# Altium footprint library RDM_ALT_PCB.PcbLib: 171 footprints (part 8 of 11)
Each footprint in its own frame and in the unit in brackets; x right, y up, seen from the top. Pads: shape width x height; smd on the part's side, far side on the other; paste and mask are expansions set on the pad; w line width, h text height; cw(c..) or ccw(c..) is an arc to the next point about the centre after c.
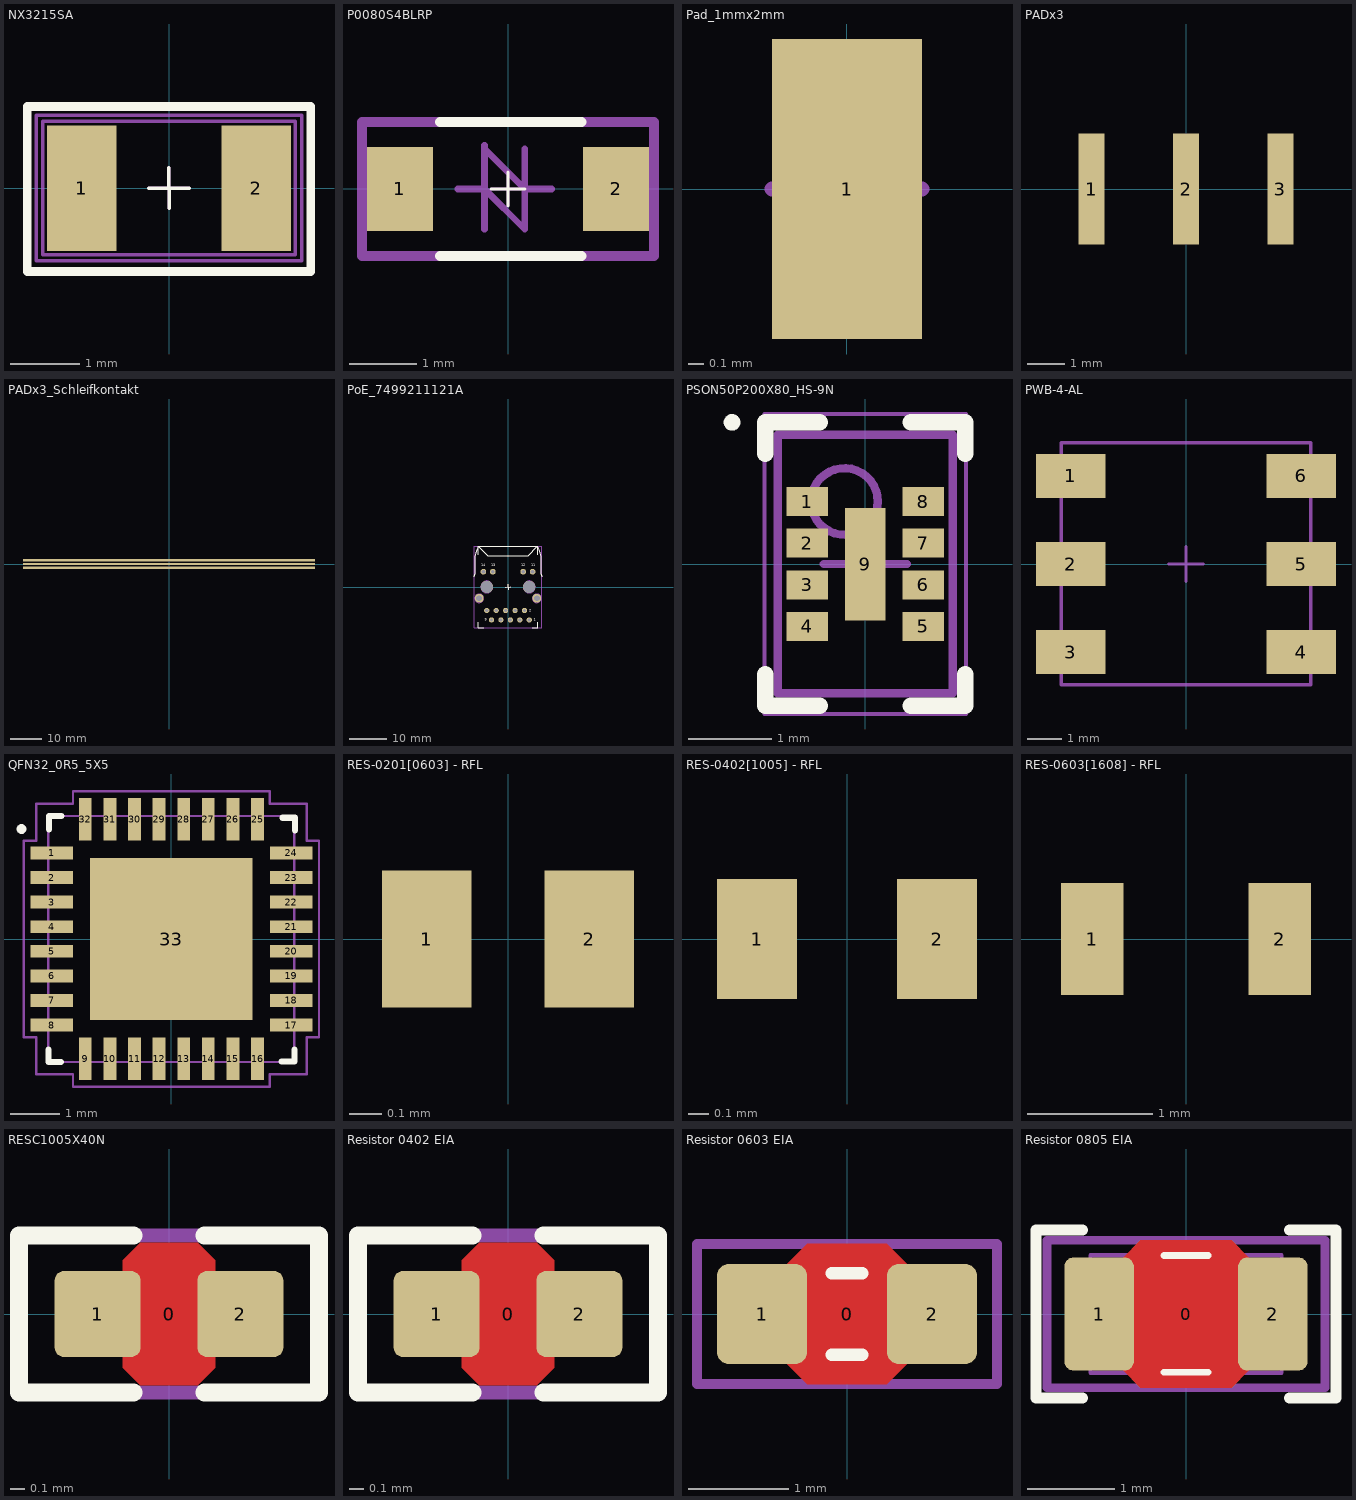
[diagram p7: the footprints below, top view; thin cyan lines are the x and y axes]

## NX3215SA [mm] "CRYSTAL NDK America 2-SMD, No Lead"
pads (2):
  rect 1x1.8 smd: 1(-1.25,0) 2(1.25,0)
Top Overlay:
  lines w0.05: -0.29,-0.002 0.291,0.001 ; -0.001,0.29 0.002,-0.291
  lines w0.127: -2.032,-1.194 2.032,-1.194 2.032,1.168 -2.032,1.168 -2.032,-1.194
Mechanical 13:
  lines w0.05: -0.29,-0.002 0.291,0.001 ; -0.001,0.29 0.002,-0.291 ; -1.905,-1.041 -1.905,1.041 1.905,1.041 1.905,-1.041 -1.905,-1.041
Mechanical 15:
  lines w0.05: -0.289,-0.003 0.292,0 ; 0,0.289 0.003,-0.292 ; -1.809,-0.955 1.812,-0.955 1.812,0.959 -1.809,0.959 -1.809,-0.955
3D body "ABS07-120-32.768KHZ-T--3DModel-STEP-56544.STEP": height 0.89, standoff -0.01, extent -1.6,-0.75 1.6,0.75

## P0080S4BLRP [mm] "SOD-123FL_Package"
height 1.08
pads (2):
  rect 0.98x1.25 smd: 1(-1.61,0) 2(1.61,0)
Top Overlay:
  lines w0.05: -0.248,0 0.248,0 ; 0,-0.248 0,0.248
  lines w0.15: -1.016,-1 1.092,-1 ; -1.016,1 1.092,1
Mechanical 13:
  lines w0.05: -0.248,0 0.248,0 ; 0,-0.248 0,0.248
  lines w0.15: 2.175,1 2.175,-1 -2.175,-1 -2.175,1 2.175,1
Mechanical 15:
  lines w0.1: -0.75,0 -0.35,0 0.25,-0.6 0.25,0.6 ; -0.35,-0.6 -0.35,0.6 ; -0.35,0.65 -0.35,0.6 ; 0.65,0 0.25,0 -0.35,0.6
  lines w0.15: 2.175,1 2.175,-1 -2.175,-1 -2.175,1 2.175,1
3D body "SMF16A--3DModel-STEP-56544.STEP": height 1.01, standoff -0.09, extent -1.825,-0.875 1.825,0.875

## Pad_1mmx2mm [mm] "Pad_1mmx2mm"
pads (1):
  rect 1x2 smd paste-1: 1(0,0)
Mechanical 15:
  lines w0.1: -0.5,0 0.5,0 ; 0,-0.5 0,0.5

## PADx3 [mm] "3 PADS"
pads (3):
  rect 0.7x3 smd: 1(-2.54,0) 2(0,0) 3(2.54,0)

## PADx3_Schleifkontakt [mm] "3 PADS"
pads (3):
  rect 93.8x0.8 smd: 1(0,1.27) 2(0,0) 3(0,-1.27)

## PoE_7499211121A [mm] "1 Port RJ45 Magjac, Power over Ethernet"
pads (18):
  round 1.4 hole 0.9: 1(5.715,-8.86) 2(4.445,-6.32) 3(3.175,-8.86) 4(1.905,-6.32) 5(0.635,-8.86) 6(-0.635,-6.32) 7(-1.905,-8.86) 8(-3.175,-6.32) 9(-4.445,-8.86) 10(-5.715,-6.32)
  round 1.52 hole 1.02: 11(6.63,4.11) 12(4.09,4.11) 13(-4.09,4.11) 14(-6.63,4.11)
  round 2.4 hole 1.6: Shield(-7.745,-3.02) Shield(7.745,-3.02)
  round 3.25 hole 3.25 unplated: ""(-5.715,0.03) ""(5.715,0.03)
Top Overlay:
  lines w0.254: -9.102,2.811 ccw(c-10.213,3.423) -8.946,3.48 -8.953,4.892 cw(c-5.338,5.332) -8.98,5.362 cw(c15.684,6.19) -8.909,8.234 cw(c-0.49,6.715) -7.94,10.92 ; -7.94,-9.525 -7.94,-10.92 -6.545,-10.92 ; -7.94,8.715 -7.94,10.92 ; -0.706,-0.004 0.706,0.004 ; -0.004,0.706 0.004,-0.706 ; 6.545,-10.92 7.94,-10.92 7.94,-9.525 ; 7.915,10.916 5.385,8.386 5.381,8.382 -5.41,8.382 -7.94,10.912 -7.94,10.92 ; 7.94,8.715 7.94,10.92 ; 9.102,2.811 cw(c10.213,3.423) 8.946,3.48 8.953,4.892 ccw(c5.338,5.332) 8.98,5.362 ccw(c-15.685,6.19) 8.909,8.234 ccw(c0.49,6.715) 7.94,10.92 ; -7.94,10.92 7.94,10.92
  text "1" at 6.985,-9.144 h0.7
  text "2" at 5.715,-6.604 h0.7
  text "9" at -6.223,-9.144 h0.7
  text "12" at 3.556,5.588 h0.7
  text "11" at 6.223,5.588 h0.7
  text "13" at -4.445,5.588 h0.7
  text "14" at -7.239,5.588 h0.7
Mechanical 13:
  lines w0.1: -0.706,-0.004 0.706,0.004 ; -0.004,0.706 0.004,-0.706 ; 9.102,-10.92 -9.102,-10.92 -9.102,10.92 9.102,10.92 ; 9.119,-10.92 9.119,10.92
Mechanical 15:
  circle w0.254: c-5.715,0.026 r1.6
  circle w0.254: c5.715,0.026 r1.6
  circle w0.254: c-7.747,-3.048 r1.162
  circle w0.254: c7.747,-3.048 r1.162
  lines w0.254: -9.102,2.811 ccw(c-10.213,3.423) -8.946,3.48 -8.953,4.892 cw(c-5.338,5.332) -8.98,5.362 cw(c15.684,6.19) -8.909,8.234 cw(c-0.49,6.715) -7.94,10.92 ; -0.706,-0.004 0.706,0.004 ; -0.004,0.706 0.004,-0.706 ; 7.94,10.92 cw(c0.49,6.715) 8.909,8.234 cw(c-15.685,6.19) 8.98,5.362 cw(c5.338,5.332) 8.953,4.892 8.946,3.48 ccw(c10.213,3.423) 9.102,2.811 ; 9.102,-10.92 -9.102,-10.92 -9.102,10.92 9.102,10.92 ; 9.119,-10.92 9.119,10.92
3D body "7499211121A.stp": height 15.79, standoff -3.37, extent -9.111,-10.92 9.11,10.92

## PSON50P200X80_HS-9N [mm] "PSON, 8-Leads, Body 3.00x2.00mm, Pitch 0.50mm, Thermal Pad 1.35x0.49mm, IPC Medium Density"
height 0.8
pads (9):
  rect 0.5x0.35 smd: 1(-0.695,0.75) 2(-0.695,0.25) 3(-0.695,-0.25) 4(-0.695,-0.75) 5(0.695,-0.75) 6(0.695,-0.25) 7(0.695,0.25) 8(0.695,0.75)
  rect 0.49x1.35 smd: 9(0,0)
Top Overlay:
  circle w0.1: c-1.6,1.7 r0.05
  lines w0.2: -1.2,-1.325 -1.2,-1.7 -0.545,-1.7 ; -1.2,1.325 -1.2,1.7 -0.545,1.7 ; 0.545,-1.7 1.2,-1.7 1.2,-1.325 ; 0.545,1.7 1.2,1.7 1.2,1.325
Mechanical 13:
  circle w0.1: c-0.25,0.75 r0.4
  lines w0.1: -1.05,-1.55 1.05,-1.55 1.05,1.55 -1.05,1.55 -1.05,-1.55
Mechanical 15:
  lines w0.05: -1.21,-1.8 1.21,-1.8 1.21,1.8 -1.21,1.8 -1.21,-1.8
  lines w0.1: -0.5,0 0.5,0 ; 0,-0.5 0,0.5
3D body: height 0.8, standoff 0.03, extent -1.05,-1.55 1.05,1.55

## PWB-4-AL [mm] "Surface Mount Wideband RF Transformer"
height 3.7
pads (6):
  rect 2x1.27 smd: 1(-3.325,2.54) 2(-3.325,0) 3(-3.325,-2.54) 4(3.325,-2.54) 5(3.325,0) 6(3.325,2.54)
Mechanical 13:
  lines w0.1: -3.6,-3.485 -3.6,3.5 3.6,3.5 3.6,-3.485 -3.6,-3.485
Mechanical 15:
  lines w0.1: -0.5,0 0.5,0 ; 0,-0.5 0,0.5
3D body "Coilcraft-PWB Series.step": height 4.65, standoff 0, extent -3.6,-3.485 3.6,3.485

## QFN32_0R5_5X5 [mm] "USB  IC TRANSCEIVER"
pads (33):
  rect 0.86x0.26 smd: 1(-2.435,1.75) 2(-2.435,1.25) 3(-2.435,0.75) 4(-2.435,0.25) 5(-2.435,-0.25) 6(-2.435,-0.75) 7(-2.435,-1.25) 8(-2.435,-1.75) 17(2.435,-1.75) 18(2.435,-1.25) 19(2.435,-0.75) 20(2.435,-0.25) 21(2.435,0.25) 22(2.435,0.75) 23(2.435,1.25) 24(2.435,1.75)
  rect 0.26x0.86 smd: 9(-1.75,-2.435) 10(-1.25,-2.435) 11(-0.75,-2.435) 12(-0.25,-2.435) 13(0.25,-2.435) 14(0.75,-2.435) 15(1.25,-2.435) 16(1.75,-2.435) 25(1.75,2.435) 26(1.25,2.435) 27(0.75,2.435) 28(0.25,2.435) 29(-0.25,2.435) 30(-0.75,2.435) 31(-1.25,2.435) 32(-1.75,2.435)
  rect 3.3x3.3 smd: 33(0,0)
Top Overlay:
  circle w0.1: c-3.048,2.235 r0.05
  lines w0.127: -2.5,-2.246 -2.5,-2.5 -2.246,-2.5 ; -2.489,2.227 -2.489,2.481 ; -2.489,2.5 -2.235,2.5 ; 2.235,-2.489 2.5,-2.489 2.5,-2.246 ; 2.261,2.464 2.515,2.464 2.515,2.21
Top Paste:
  region: 0.16,1.33 1.33,1.33 1.33,0.16 0.16,0.16
  region: -1.332,-0.16 -0.16,-0.16 -0.16,-1.332 -1.332,-1.332
  region: -1.331,1.33 -0.16,1.33 -0.16,0.16 -1.331,0.16
  region: 0.16,-0.16 1.33,-0.16 1.33,-1.332 0.16,-1.332
Mechanical 13:
  lines w0.05: -0.3,0 0.3,0 ; 0,-0.3 0,0.3 ; -3,-2 -2.75,-2 -2.75,-2.75 -2,-2.75 -2,-3 2,-3 2,-2.75 2.75,-2.75 2.75,-2 3,-2 3,2 2.75,2 2.75,2.75 2,2.75 2,3 -2,3 -2,2.75 -2.75,2.75 -2.75,2 -3,2 -3,-2 ; -2.5,-2.5 -2.5,2.5 2.5,2.5 2.5,-2.5 -2.5,-2.5
Mechanical 15:
  lines w0.05: -0.3,0 0.3,0 ; 0,-0.3 0,0.3 ; -3,-2 -3,2 -2.75,2 -2.75,2.75 -2,2.75 -2,3 2,3 2,2.75 2.75,2.75 2.75,2 3,2 3,-2 2.75,-2 2.75,-2.75 2,-2.75 2,-3 -2,-3 -2,-2.75 -2.75,-2.75 -2.75,-2 -3,-2 ; -2.5,-2.5 2.5,-2.5 2.5,2.5 -2.5,2.5 -2.5,-2.5
3D body "QFN-32_3D_Model.STEP": height 0.8, standoff 0, extent -2.601,-2.601 2.601,2.601

## RES-0201[0603] - RFL [mm]
pads (2):
  rect 0.28x0.43 smd: 1(-0.255,0) 2(0.255,0)
3D body "User Library-SMD RESISTOR-10201.STEP": height 0.22, standoff -0.02, extent -0.3,-0.15 0.3,0.15

## RES-0402[1005] - RFL [mm] "SMD Chip 0402 - RES - RFL"
height 0.4
pads (2):
  rect 0.4x0.6 smd: 1(-0.45,0) 2(0.45,0)
3D body "RES0402.step": height 0.33, standoff -0.03, extent -0.5,-0.25 0.5,0.25

## RES-0603[1608] - RFL [mm] "SMD Chip 0603 - RES - RFL"
height 0.55
pads (2):
  rect 0.5x0.9 smd: 1(-0.75,0) 2(0.75,0)
3D body "RES0603.step": height 0.43, standoff -0.02, extent -0.8,-0.4 0.8,0.4

## RESC1005X40N [mm] "Chip Resistor, Body 1.0x0.5mm, EIA 0402, IPC Medium Density"
height 0.4
pads (3):
  round 0.2 on Mech15: 0(0,0)
  rrect20% 0.6x0.6 smd: 1(-0.5,0) 2(0.5,0)
Top Layer:
  pour cut-out: -0.325,0.375 -0.2,0.5 0.2,0.5 0.325,0.375 0.325,-0.375 0.2,-0.5 -0.2,-0.5 -0.325,-0.375
Top Overlay:
  lines w0.127: -0.25,-0.55 -1.05,-0.55 -1.05,0.55 -0.25,0.55 ; 0.25,-0.55 1.05,-0.55 1.05,0.55 0.25,0.55
Mechanical 13:
  lines w0.05: 0.225,-0.274 -0.225,-0.274 0.225,-0.274 ; -0.525,-0.275 -0.525,0.275 -0.225,0.275 -0.225,-0.275 -0.525,-0.275 ; -0.225,0.274 0.225,0.274 -0.225,0.274 ; 0.225,-0.275 0.525,-0.275 0.525,0.275 0.225,0.275 0.225,-0.275
Mechanical 15:
  lines w0.1: -1.05,-0.55 -1.05,0.55 1.05,0.55 1.05,-0.55 -1.05,-0.55
3D body "RES 0402 (1005 metric).STEP": height 0.4, standoff 0, extent -0.525,-0.275 0.525,0.275

## Resistor 0402 EIA [mm]
pads (3):
  round 0.2 on Mech15: 0(0,0)
  rrect20% 0.6x0.6 smd: 1(-0.5,0) 2(0.5,0)
Top Layer:
  pour cut-out: -0.325,0.375 -0.2,0.5 0.2,0.5 0.325,0.375 0.325,-0.375 0.2,-0.5 -0.2,-0.5 -0.325,-0.375
Top Overlay:
  lines w0.127: -0.25,-0.55 -1.05,-0.55 -1.05,0.55 -0.25,0.55 ; 0.25,-0.55 1.05,-0.55 1.05,0.55 0.25,0.55
Mechanical 13:
  lines w0.05: 0.225,-0.274 -0.225,-0.274 0.225,-0.274 ; -0.525,-0.275 -0.225,-0.275 -0.225,0.275 -0.525,0.275 -0.525,-0.275 ; -0.225,0.274 0.225,0.274 -0.225,0.274 ; 0.225,-0.275 0.225,0.275 0.525,0.275 0.525,-0.275 0.225,-0.275
Mechanical 15:
  lines w0.1: -1.05,-0.55 1.05,-0.55 1.05,0.55 -1.05,0.55 -1.05,-0.55
3D body "RES 0402 (1005 metric).STEP": height 0.4, standoff 0, extent -0.525,-0.275 0.525,0.275

## Resistor 0603 EIA [mm]
pads (3):
  round 0.254 on Mech15: 0(0,0)
  rrect25% 0.9x1 smd: 1(-0.85,0) 2(0.85,0)
Top Layer:
  pour cut-out: -0.6,0.5 -0.4,0.7 0.4,0.7 0.6,0.5 0.6,-0.5 0.4,-0.7 -0.4,-0.7 -0.6,-0.5
Top Overlay:
  lines w0.127: -0.152,-0.406 0.152,-0.406 ; -0.152,0.406 0.152,0.406
Mechanical 13:
  lines w0.05: -0.875,-0.475 -0.475,-0.475 -0.475,0.475 -0.875,0.475 -0.875,-0.475 ; -0.475,-0.474 0.475,-0.474 -0.475,-0.474 ; -0.475,0.474 0.475,0.474 -0.475,0.474 ; 0.475,-0.475 0.475,0.475 0.875,0.475 0.875,-0.475 0.475,-0.475
Mechanical 15:
  lines w0.1: -1.5,-0.7 -1.5,0.7 1.5,0.7 1.5,-0.7 -1.5,-0.7
3D body "RES 0603 (1608 metric).STEP": height 0.54, standoff -0.01, extent -0.875,-0.475 0.875,0.475

## Resistor 0805 EIA [mm]
pads (3):
  round 0.254 on Mech15: 0(0,0)
  rrect25% 0.8x1.3 smd: 1(-1,0) 2(1,0)
Top Layer:
  pour cut-out: -0.725,0.65 -0.525,0.85 0.525,0.85 0.725,0.65 0.725,-0.65 0.525,-0.85 -0.525,-0.85 -0.725,-0.65
Top Overlay:
  lines w0.076: -0.254,-0.673 0.254,-0.673 ; -0.254,0.674 0.254,0.674
  lines w0.127: -1.194,-0.965 -1.727,-0.965 -1.727,0.965 -1.194,0.965 ; 1.194,-0.965 1.727,-0.965 1.727,0.965 1.194,0.965
Mechanical 13:
  lines w0.05: 0.6,-0.674 -0.6,-0.674 ; -0.6,-0.674 0.6,-0.674 ; -0.6,-0.675 -1.1,-0.675 -1.1,0.675 -0.6,0.675 -0.6,-0.675 ; 0.6,-0.675 1.1,-0.675 1.1,0.675 0.6,0.675 ; 0.6,-0.675 0.6,0.675 ; 0.6,0.674 -0.6,0.674 0.6,0.674
Mechanical 15:
  lines w0.1: -1.6,-0.85 -1.6,0.85 1.6,0.85 1.6,-0.85 -1.6,-0.85
3D body "RES 0805 (2012 metric).STEP": height 0.69, standoff -0.01, extent -1.1,-0.675 1.1,0.675